# Altium footprint library UZ_CarrierBoard.PcbLib: 91 footprints (part 5 of 6)
Each footprint in its own frame and in the unit in brackets; x right, y up, seen from the top. Pads: shape width x height; smd on the part's side, far side on the other; paste and mask are expansions set on the pad; w line width, h text height; cw(c..) or ccw(c..) is an arc to the next point about the centre after c.
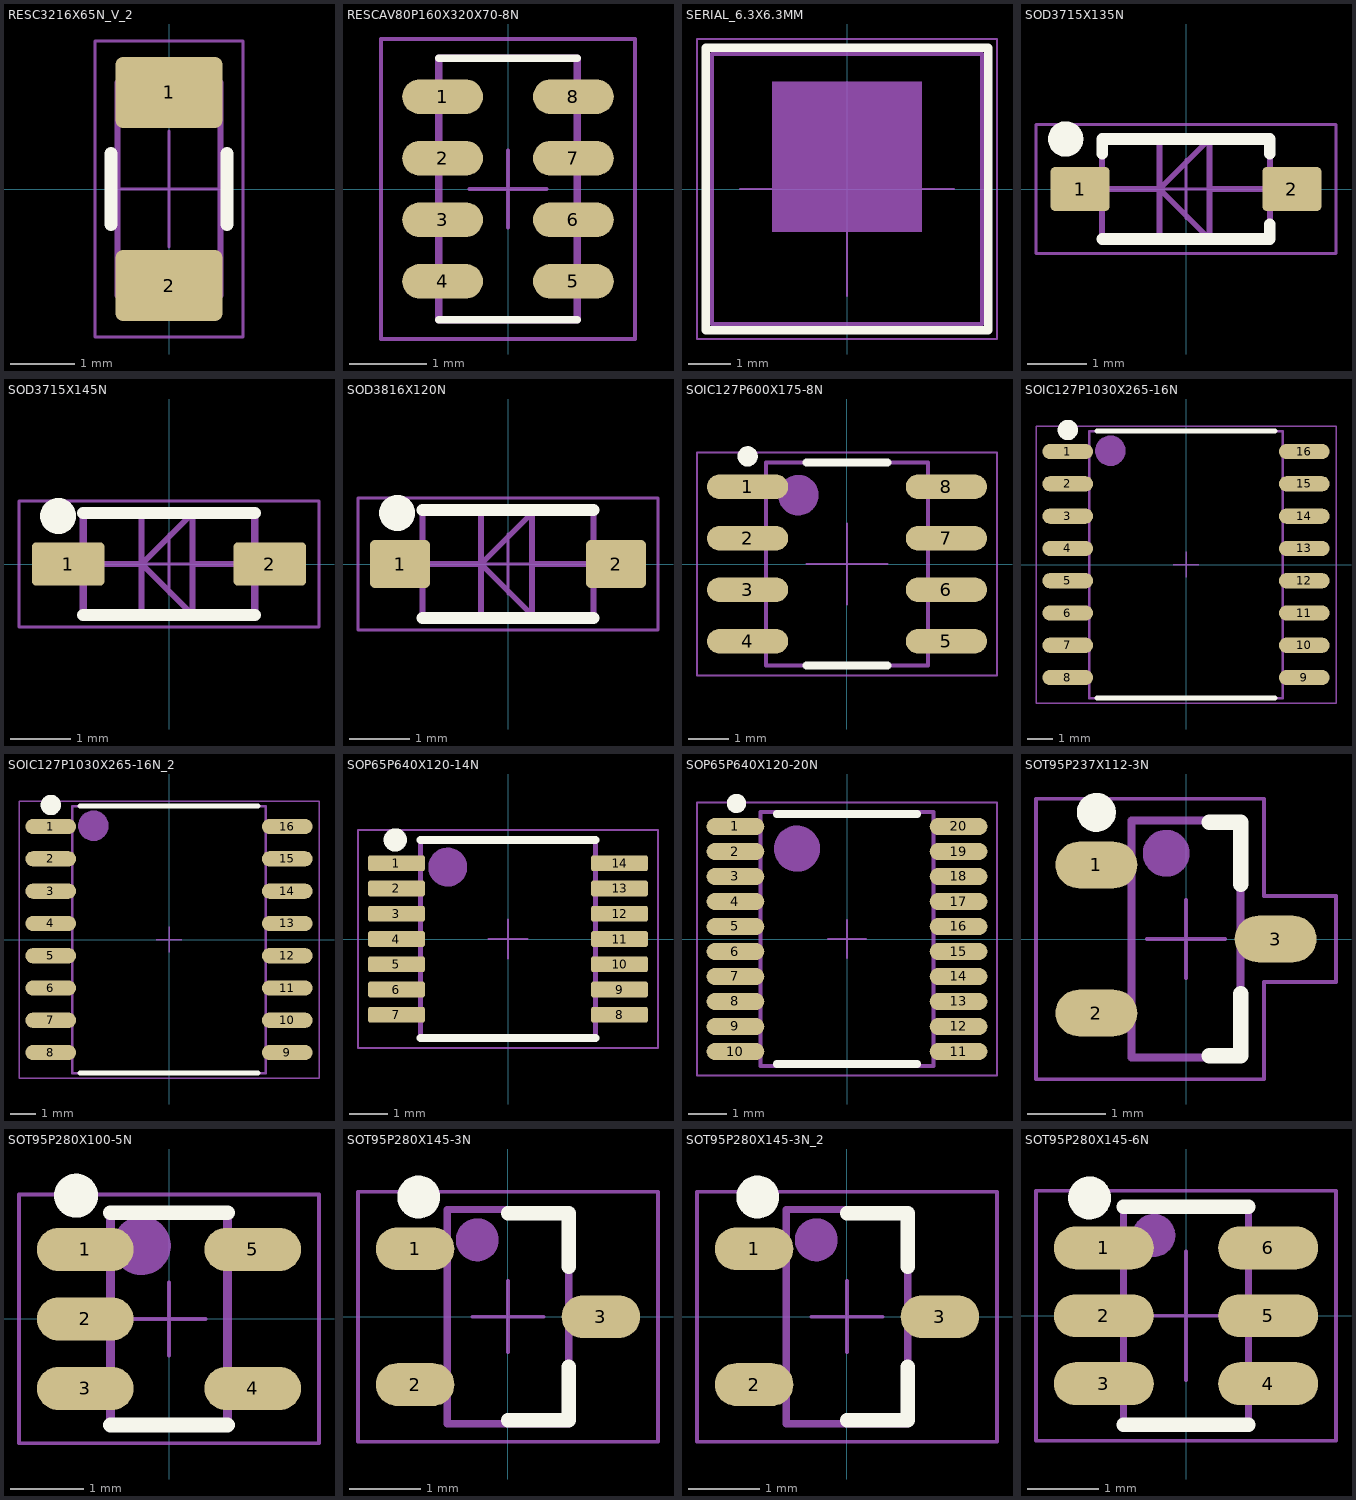
[diagram p4: the footprints below, top view; thin cyan lines are the x and y axes]

## RESC3216X65N_V_2 [mm]
pads (2):
  rrect20% 1.66x1.1 smd: 1(0,1.5) 2(0,-1.5)
Top Overlay:
  lines w0.2: -0.9,-0.55 -0.9,0.55 ; 0.9,-0.55 0.9,0.55
Mechanical 13:
  lines w0.1: -0.8,-1.1 0.8,-1.1 ; -0.8,1.1 0.8,1.1 ; -0.8,-1.65 0.8,-1.65 0.8,1.65 -0.8,1.65 -0.8,-1.65
  text ".Designator" at 1.692,-1.663 h0.7
Mechanical 15:
  lines w0.05: -0.9,0 0,0 ; 0,-0.9 0,0 ; 0,0.9 0,0 ; 0.9,0 0,0 ; -1.15,-2.3 -1.15,0 -1.15,2.3 1.15,2.3 1.15,-2.3 -1.15,-2.3
3D body "RESC3216X60L45.STEP": height 0.6, standoff 0, extent -0.8,-1.625 0.8,1.625

## RESCAV80P160X320X70-8N [mm]
pads (8):
  oval 1.05x0.45 smd: 1(-0.85,1.2) 2(-0.85,0.4) 3(-0.85,-0.4) 4(-0.85,-1.2) 5(0.85,-1.2) 6(0.85,-0.4) 7(0.85,0.4) 8(0.85,1.2)
Top Overlay:
  lines w0.1: -0.9,-1.7 0.9,-1.7 ; -0.9,1.7 0.9,1.7
Mechanical 13:
  lines w0.1: -0.9,-1.7 -0.9,1.7 0.9,1.7 0.9,-1.7 -0.9,-1.7
  text ".Designator" at 1.126,1.869 h1
Mechanical 15:
  lines w0.05: -0.5,0 0.5,0 ; 0,-0.5 0,0.5 ; -1.65,-1.95 -1.65,1.95 1.65,1.95 1.65,-1.95 -1.65,-1.95
3D body: height 0.7, standoff 0, extent -0.95,-1.75 0.95,1.75

## SERIAL_6.3X6.3MM [mm]
Top Overlay:
  lines w0.2: -3.3,-3.3 -3.3,3.3 3.3,3.3 3.3,-3.3 -3.3,-3.3
Mechanical 5:
  region: -1.75,2.5 -1.75,-1 1.75,-1 1.75,2.5
  lines w0.1: -3.15,-3.15 3.15,-3.15 3.15,3.15 -3.15,3.15 -3.15,-3.15
  text "SerialNr" at 2.5,-1.7 h0.7
Mechanical 15:
  lines w0.05: -2.5,0 2.5,0 ; 0,-2.5 0,2.5 ; -3.5,-3.5 -3.5,3.5 3.5,3.5 3.5,-3.5 -3.5,-3.5

## SOD3715X135N [mm]
pads (2):
  rrect20% 1x0.75 smd: 1(-1.8,0) 2(1.8,0)
Top Overlay:
  circle w0.3: c-2.045,0.85 r0.15
  lines w0.2: -1.425,-0.85 1.425,-0.85 1.425,-0.6 ; -1.425,0.6 -1.425,0.85 1.2,0.85 1.425,0.85 1.425,0.6
Mechanical 13:
  lines w0.05: 1.425,0 1.425,0
  lines w0.1: -1.425,-0.3 -1.45,-0.275 -1.925,-0.275 -1.924,0.275 -1.45,0.275 -1.425,0.25 ; -1.425,0 -0.45,0 ; -0.45,-0.85 -0.45,0 ; -0.45,0.85 -0.45,0 ; 0.4,0 1.425,0 ; 0.45,-0.85 0.4,-0.8 0.4,0.85 -0.45,0 ; 1.45,-0.275 1.925,-0.275 1.924,0.275 1.45,0.275 ; -0.45,0 0.4,-0.85 ; -0.45,0 -0.45,0 ; 0.4,-0.85 0.4,-0.85 ; 1.425,0 1.425,0 ; -1.425,-0.85 1.425,-0.85 1.425,0.85 -1.425,0.85 -1.425,-0.85
  text ".Designator" at -1.267,-2.235 h1
Mechanical 15:
  lines w0.05: -0.5,0 0.5,0 ; 0,-0.5 0,0.5 ; -2.55,-1.1 2.55,-1.1 2.55,1.1 -2.55,1.1 -2.55,-1.1
3D body "SOD3716X135.STEP": height 1.35, standoff 0, extent -1.855,-0.8 1.855,0.8

## SOD3715X145N [mm]
pads (2):
  rrect20% 1.21x0.72 smd: 1(-1.68,0) 2(1.68,0)
Top Overlay:
  circle w0.3: c-1.85,0.8 r0.15
  lines w0.2: -1.43,-0.85 1.43,-0.85 ; -1.43,0.85 1.43,0.85
Mechanical 13:
  lines w0.1: -1.43,0 -0.455,0 ; -0.455,-0.85 -0.455,0 ; -0.455,0.85 -0.455,0 ; 0.395,0 1.42,0 ; 0.445,-0.85 0.395,-0.8 0.395,0.85 -0.455,0 ; -0.455,0 0.395,-0.85 ; -0.455,0 -0.455,0 ; 0.395,-0.85 0.395,-0.85
  lines w0.12: -1.43,-0.85 1.43,-0.85 1.43,0.85 -1.43,0.85 -1.43,-0.85
  text ".Designator" at -2.079,0.445 h1
Mechanical 15:
  lines w0.05: -0.5,0 0.5,0 ; 0,-0.5 0,0.5 ; -2.5,-1.05 2.5,-1.05 2.5,1.05 -2.5,1.05 -2.5,-1.05
3D body "User Library-SOD-123_DiodesInc.STEP": height 1.42, standoff -0.03, extent -1.925,-0.85 1.925,0.85

## SOD3816X120N [mm]
pads (2):
  rrect20% 1x0.8 smd: 1(-1.8,0) 2(1.8,0)
Top Overlay:
  circle w0.3: c-1.85,0.85 r0.15
  lines w0.2: -1.425,-0.9 1.425,-0.9 ; -1.425,0.9 1.425,0.9
Mechanical 13:
  lines w0.05: -1.425,0 -1.425,0 ; 1.425,0 1.425,0
  lines w0.1: -1.45,-0.35 -1.95,-0.35 -1.95,0.35 -1.45,0.35 ; -1.425,0 -0.45,0 ; -0.45,-0.9 -0.45,0.9 ; 0.4,-0.9 0.4,0.9 ; 0.4,-0.85 -0.45,0 ; 0.4,0 1.425,0 ; 1.45,-0.35 1.95,-0.35 1.95,0.35 1.45,0.35 ; -0.45,0 0.4,0.85 ; -0.45,0 -0.45,0 ; 0.4,0.85 0.4,0.85 ; -1.425,-0.9 1.425,-0.9 1.425,0.9 -1.425,0.9 -1.425,-0.9
  text ".Designator" at -1.397,-2.159 h1
Mechanical 15:
  lines w0.05: -0.5,0 0.5,0 ; 0,-0.5 0,0.5 ; -2.5,-1.1 2.5,-1.1 2.5,1.1 -2.5,1.1 -2.5,-1.1
3D body: height 1.2, standoff 0, extent -1.425,-0.9 1.425,0.9

## SOIC127P600X175-8N [mm]
pads (8):
  oval 2x0.6 smd: 1(-2.45,1.905) 2(-2.45,0.635) 3(-2.45,-0.635) 4(-2.45,-1.905) 5(2.45,-1.905) 6(2.45,-0.635) 7(2.45,0.635) 8(2.45,1.905)
Top Overlay:
  circle w0.25: c-2.45,2.655 r0.125
  lines w0.2: -1,-2.5 1,-2.5 ; -1,2.5 1,2.5
Mechanical 13:
  circle w0.5: c-1.2,1.7 r0.25
  lines w0.1: -2,-2.5 2,-2.5 2,2.5 -2,2.5 -2,-2.5
  text ".Designator" at 0.651,-1.03 h1
Mechanical 15:
  lines w0.05: -1,0 1,0 ; 0,-1 0,1 ; -3.7,-2.75 3.7,-2.75 3.7,2.75 -3.7,2.75 -3.7,-2.75
3D body "SOIC-8-1.STEP": height 1.75, standoff 0, extent -3,-2.45 3,2.45

## SOIC127P1030X265-16N [mm]
pads (16):
  oval 2x0.6 smd: 1(-4.65,4.445) 2(-4.65,3.175) 3(-4.65,1.905) 4(-4.65,0.635) 5(-4.65,-0.635) 6(-4.65,-1.905) 7(-4.65,-3.175) 8(-4.65,-4.445) 9(4.65,-4.445) 10(4.65,-3.175) 11(4.65,-1.905) 12(4.65,-0.635) 13(4.65,0.635) 14(4.65,1.905) 15(4.65,3.175) 16(4.65,4.445)
Top Overlay:
  circle w0.4: c-4.65,5.295 r0.2
  lines w0.2: -3.5,-5.25 3.5,-5.25 ; -3.5,5.25 3.5,5.25
Mechanical 13:
  circle w0.6: c-2.975,4.475 r0.3
  lines w0.1: -3.8,-5.25 -3.8,5.25 3.8,5.25 3.8,-5.25 -3.8,-5.25
  text ".Designator" at -2,0 h1
Mechanical 15:
  lines w0.05: -0.5,0 0.5,0 ; 0,-0.5 0,0.5 ; -5.9,-5.45 -5.9,5.45 5.9,5.45 5.9,-5.45 -5.9,-5.45
3D body "User Library-SOIC16_Wide_JEDEC_MS-013AA.STEP": height 2.64, standoff -0.01, extent -5.315,-5.25 5.315,5.25

## SOIC127P1030X265-16N_2 [mm]
pads (16):
  oval 2x0.6 smd: 1(-4.65,4.445) 2(-4.65,3.175) 3(-4.65,1.905) 4(-4.65,0.635) 5(-4.65,-0.635) 6(-4.65,-1.905) 7(-4.65,-3.175) 8(-4.65,-4.445) 9(4.65,-4.445) 10(4.65,-3.175) 11(4.65,-1.905) 12(4.65,-0.635) 13(4.65,0.635) 14(4.65,1.905) 15(4.65,3.175) 16(4.65,4.445)
Top Overlay:
  circle w0.4: c-4.65,5.295 r0.2
  lines w0.2: -3.5,-5.25 3.5,-5.25 ; -3.5,5.25 3.5,5.25
Mechanical 13:
  circle w0.6: c-2.975,4.475 r0.3
  lines w0.1: -3.8,-5.25 -3.8,5.25 3.8,5.25 3.8,-5.25 -3.8,-5.25
  text ".Designator" at 0.77,-1.354 h1
Mechanical 15:
  lines w0.05: -0.5,0 0.5,0 ; 0,-0.5 0,0.5 ; -5.9,-5.45 -5.9,5.45 5.9,5.45 5.9,-5.45 -5.9,-5.45
3D body "User Library-SOIC16_Wide_JEDEC_MS-013AA.STEP": height 2.64, standoff -0.01, extent -5.315,-5.25 5.315,5.25

## SOP65P640X120-14N [mm]
pads (14):
  rrect33% 1.47x0.41 smd: 1(-2.87,1.95) 2(-2.87,1.3) 3(-2.87,0.65) 4(-2.87,0) 5(-2.87,-0.65) 6(-2.87,-1.3) 7(-2.87,-1.95) 8(2.87,-1.95) 9(2.87,-1.3) 10(2.87,-0.65) 11(2.87,0) 12(2.87,0.65) 13(2.87,1.3) 14(2.87,1.95)
Top Overlay:
  circle w0.3: c-2.9,2.55 r0.15
  lines w0.2: -2.25,-2.55 2.25,-2.55 ; -2.25,2.55 2.25,2.55
Mechanical 13:
  circle w0.5: c-1.55,1.85 r0.25
  lines w0.12: -2.25,-2.55 -2.25,2.55 2.25,2.55 2.25,-2.55 -2.25,-2.55
  text ".Designator" at -1.317,-2.338 h1
Mechanical 15:
  lines w0.05: -0.5,0 0.5,0 ; 0,-0.5 0,0.5 ; -3.86,-2.8 -3.86,2.8 3.86,2.8 3.86,-2.8 -3.86,-2.8
3D body "SOP65P640X120-14L25.STEP": height 1.2, standoff 0, extent -3.2,-2.5 3.2,2.5

## SOP65P640X120-20N [mm]
pads (20):
  oval 1.5x0.45 smd: 1(-2.9,2.925) 2(-2.9,2.275) 3(-2.9,1.625) 4(-2.9,0.975) 5(-2.9,0.325) 6(-2.9,-0.325) 7(-2.9,-0.975) 8(-2.9,-1.625) 9(-2.9,-2.275) 10(-2.9,-2.925) 11(2.9,-2.925) 12(2.9,-2.275) 13(2.9,-1.625) 14(2.9,-0.975) 15(2.9,-0.325) 16(2.9,0.325) 17(2.9,0.975) 18(2.9,1.625) 19(2.9,2.275) 20(2.9,2.925)
Top Overlay:
  circle w0.25: c-2.875,3.525 r0.125
  lines w0.2: -1.825,-3.25 1.825,-3.25 ; -1.825,3.25 1.825,3.25
Mechanical 13:
  circle w0.6: c-1.3,2.35 r0.3
  lines w0.05: -2.25,-3.075 -3.2,-3.075 -3.2,-2.775 -2.25,-2.775 ; -2.25,-2.425 -3.2,-2.425 -3.2,-2.125 -2.25,-2.125 ; -2.25,-1.775 -3.2,-1.775 -3.2,-1.475 -2.25,-1.475 ; -2.25,-1.125 -3.2,-1.125 -3.2,-0.825 -2.25,-0.825 ; -2.25,-0.475 -3.2,-0.475 -3.2,-0.175 -2.25,-0.175 ; -2.25,0.175 -3.2,0.175 -3.2,0.475 -2.25,0.475 ; -2.25,0.825 -3.2,0.825 -3.2,1.125 -2.25,1.125 ; -2.25,1.475 -3.2,1.475 -3.2,1.775 -2.25,1.775 ; -2.25,2.125 -3.2,2.125 -3.2,2.425 -2.25,2.425 ; -2.25,2.775 -3.2,2.775 -3.2,3.075 -2.25,3.075 ; 2.25,-3.075 3.2,-3.075 3.2,-2.775 2.25,-2.775 ; 2.25,-2.425 3.2,-2.425 3.2,-2.125 2.25,-2.125 ; 2.25,-1.775 3.2,-1.775 3.2,-1.475 2.25,-1.475 ; 2.25,-1.125 3.2,-1.125 3.2,-0.825 2.25,-0.825 ; 2.25,-0.475 3.2,-0.475 3.2,-0.175 2.25,-0.175 ; 2.25,0.175 3.2,0.175 3.2,0.475 2.25,0.475 ; 2.25,0.825 3.2,0.825 3.2,1.125 2.25,1.125 ; 2.25,1.475 3.2,1.475 3.2,1.775 2.25,1.775 ; 2.25,2.125 3.2,2.125 3.2,2.425 2.25,2.425 ; 2.25,2.775 3.2,2.775 3.2,3.075 2.25,3.075
  lines w0.1: -2.25,-3.3 2.25,-3.3 2.25,3.3 -2.25,3.3 -2.25,-3.3
  text ".Designator" at -1.494,-0.77 h1
Mechanical 15:
  lines w0.05: -0.5,0 0.5,0 ; 0,-0.5 0,0.5 ; -3.9,-3.55 3.9,-3.55 3.9,3.55 -3.9,3.55 -3.9,-3.55
3D body "PW0020A.stp": height 1.13, standoff 0, extent -3.2,-3.25 3.2,3.25

## SOT95P237X112-3N [mm]
pads (3):
  oval 1.05x0.6 smd: 1(-1.15,0.95) 2(-1.15,-0.95) 3(1.15,0)
Top Overlay:
  circle w0.25: c-1.15,1.625 r0.125
  lines w0.2: 0.3,-1.5 0.7,-1.5 0.7,-0.7 ; 0.3,1.5 0.7,1.5 0.7,0.7
Mechanical 13:
  circle w0.3: c-0.255,1.1 r0.15
  lines w0.05: -0.7,-1.175 -1.475,-1.175 -1.475,-0.725 -0.7,-0.725 ; -0.7,0.725 -1.475,0.725 -1.475,1.175 -0.7,1.175 ; 0.7,-0.225 1.475,-0.225 1.475,0.225 0.7,0.225
  lines w0.1: -0.7,-1.52 -0.7,1.52 0.7,1.52 0.7,-1.52 -0.7,-1.52
  text ".Designator" at -1.752,-0.709 h1
Mechanical 15:
  lines w0.05: -0.5,0 0.5,0 ; 0,-0.5 0,0.5 ; -1.925,-1.8 -1.925,1.8 1,1.8 1,0.55 1.925,0.55 1.925,-0.55 1,-0.55 1,-1.8 -1.925,-1.8
3D body "SOT95P237X112-3L40.STEP": height 1.12, standoff 0, extent -1.185,-1.46 1.185,1.46

## SOT95P280X100-5N [mm]
pads (5):
  oval 1.32x0.59 smd: 1(-1.145,0.95) 2(-1.145,0) 3(-1.145,-0.95) 4(1.145,-0.95) 5(1.145,0.95)
Top Overlay:
  circle w0.3: c-1.27,1.685 r0.15
  lines w0.2: -0.8,-1.45 0.8,-1.45 ; -0.8,1.45 0.8,1.45
Mechanical 13:
  circle w0.4: c-0.375,1 r0.2
  lines w0.001: -0.8,-1.45 -0.8,1.45 0.8,1.45 0.8,-1.45 -0.8,-1.45
  lines w0.12: -0.8,-1.45 0.8,-1.45 0.8,1.45 -0.8,1.45 -0.8,-1.45
  text ".Designator" at 0.58,-1.2 h0.7
Mechanical 15:
  lines w0.05: -0.5,0 0.5,0 ; 0,-0.5 0,0.5 ; -2.05,-1.7 -2.05,1.7 2.05,1.7 2.05,-1.7 -2.05,-1.7
3D body "SOT95P280X100-5L30.STEP": height 1, standoff 0, extent -1.425,-1.45 1.375,1.45

## SOT95P280X145-3N [mm]
pads (3):
  oval 1.1x0.6 smd: 1(-1.3,0.95) 2(-1.3,-0.95) 3(1.3,0)
Top Overlay:
  circle w0.3: c-1.25,1.675 r0.15
  lines w0.2: 0,-1.45 0.85,-1.45 0.85,-0.7 ; 0,1.45 0.85,1.45 0.85,0.7
Mechanical 13:
  circle w0.3: c-0.43,1.075 r0.15
  lines w0.05: -0.85,-1.15 -1.675,-1.15 -1.675,-0.75 -0.85,-0.75 ; -0.85,0.75 -1.675,0.75 -1.675,1.15 -0.85,1.15 ; 0.85,-0.2 1.675,-0.2 1.675,0.2 0.85,0.2
  lines w0.1: -0.85,-1.5 -0.85,1.5 0.85,1.5 0.85,-1.5 -0.85,-1.5
  text ".Designator" at 1.251,1.599 h1
Mechanical 15:
  lines w0.05: -0.5,0 0.5,0 ; 0,-0.5 0,0.5 ; -2.1,-1.75 -2.1,1.75 2.1,1.75 2.1,-1.75 -2.1,-1.75
3D body "SW3dPS-3-lead sot23-3.STEP": height 1.01, standoff -0.01, extent -1.25,-1.46 1.226,1.46

## SOT95P280X145-3N_2 [mm]
pads (3):
  oval 1.1x0.6 smd: 1(-1.3,0.95) 2(-1.3,-0.95) 3(1.3,0)
Top Overlay:
  circle w0.3: c-1.25,1.675 r0.15
  lines w0.2: 0,-1.45 0.85,-1.45 0.85,-0.7 ; 0,1.45 0.85,1.45 0.85,0.7
Mechanical 13:
  circle w0.3: c-0.43,1.075 r0.15
  lines w0.05: -0.85,-1.15 -1.675,-1.15 -1.675,-0.75 -0.85,-0.75 ; -0.85,0.75 -1.675,0.75 -1.675,1.15 -0.85,1.15 ; 0.85,-0.2 1.675,-0.2 1.675,0.2 0.85,0.2
  lines w0.1: -0.85,-1.5 -0.85,1.5 0.85,1.5 0.85,-1.5 -0.85,-1.5
  text ".Designator" at 0.711,-1.402 h1
Mechanical 15:
  lines w0.05: -0.5,0 0.5,0 ; 0,-0.5 0,0.5 ; -2.1,-1.75 -2.1,1.75 2.1,1.75 2.1,-1.75 -2.1,-1.75
3D body "SW3dPS-3-lead sot23-3.STEP": height 1.01, standoff -0.01, extent -1.25,-1.46 1.226,1.46

## SOT95P280X145-6N [mm]
pads (6):
  oval 1.4x0.6 smd: 1(-1.15,0.95) 2(-1.15,0) 3(-1.15,-0.95) 4(1.15,-0.95) 5(1.15,0) 6(1.15,0.95)
Top Overlay:
  circle w0.3: c-1.35,1.65 r0.15
  lines w0.2: -0.875,-1.525 0.874,-1.525 ; -0.874,1.525 0.875,1.525
Mechanical 13:
  circle w0.3: c-0.45,1.125 r0.15
  lines w0.1: -0.875,-1.525 0.875,-1.525 0.875,1.525 -0.875,1.525 -0.875,-1.525
  text ".Designator" at 0.55,-1.2 h0.7
Mechanical 15:
  lines w0.05: -0.9,0 0,0 ; 0,-0.9 0,0 ; 0,0.9 0,0 ; 0.9,0 0,0 ; -2.1,-1.75 2.1,-1.75 2.1,1.75 -2.1,1.75 -2.1,-1.75
3D body "SOT95P270X145-6L50.STEP": height 1.45, standoff 0, extent -1.35,-1.45 1.35,1.45